# Altium footprint library connecteurs.PcbLib: 162 footprints (part 4 of 11)
Each footprint in its own frame and in the unit in brackets; x right, y up, seen from the top. Pads: shape width x height; smd on the part's side, far side on the other; paste and mask are expansions set on the pad; w line width, h text height; cw(c..) or ccw(c..) is an arc to the next point about the centre after c.
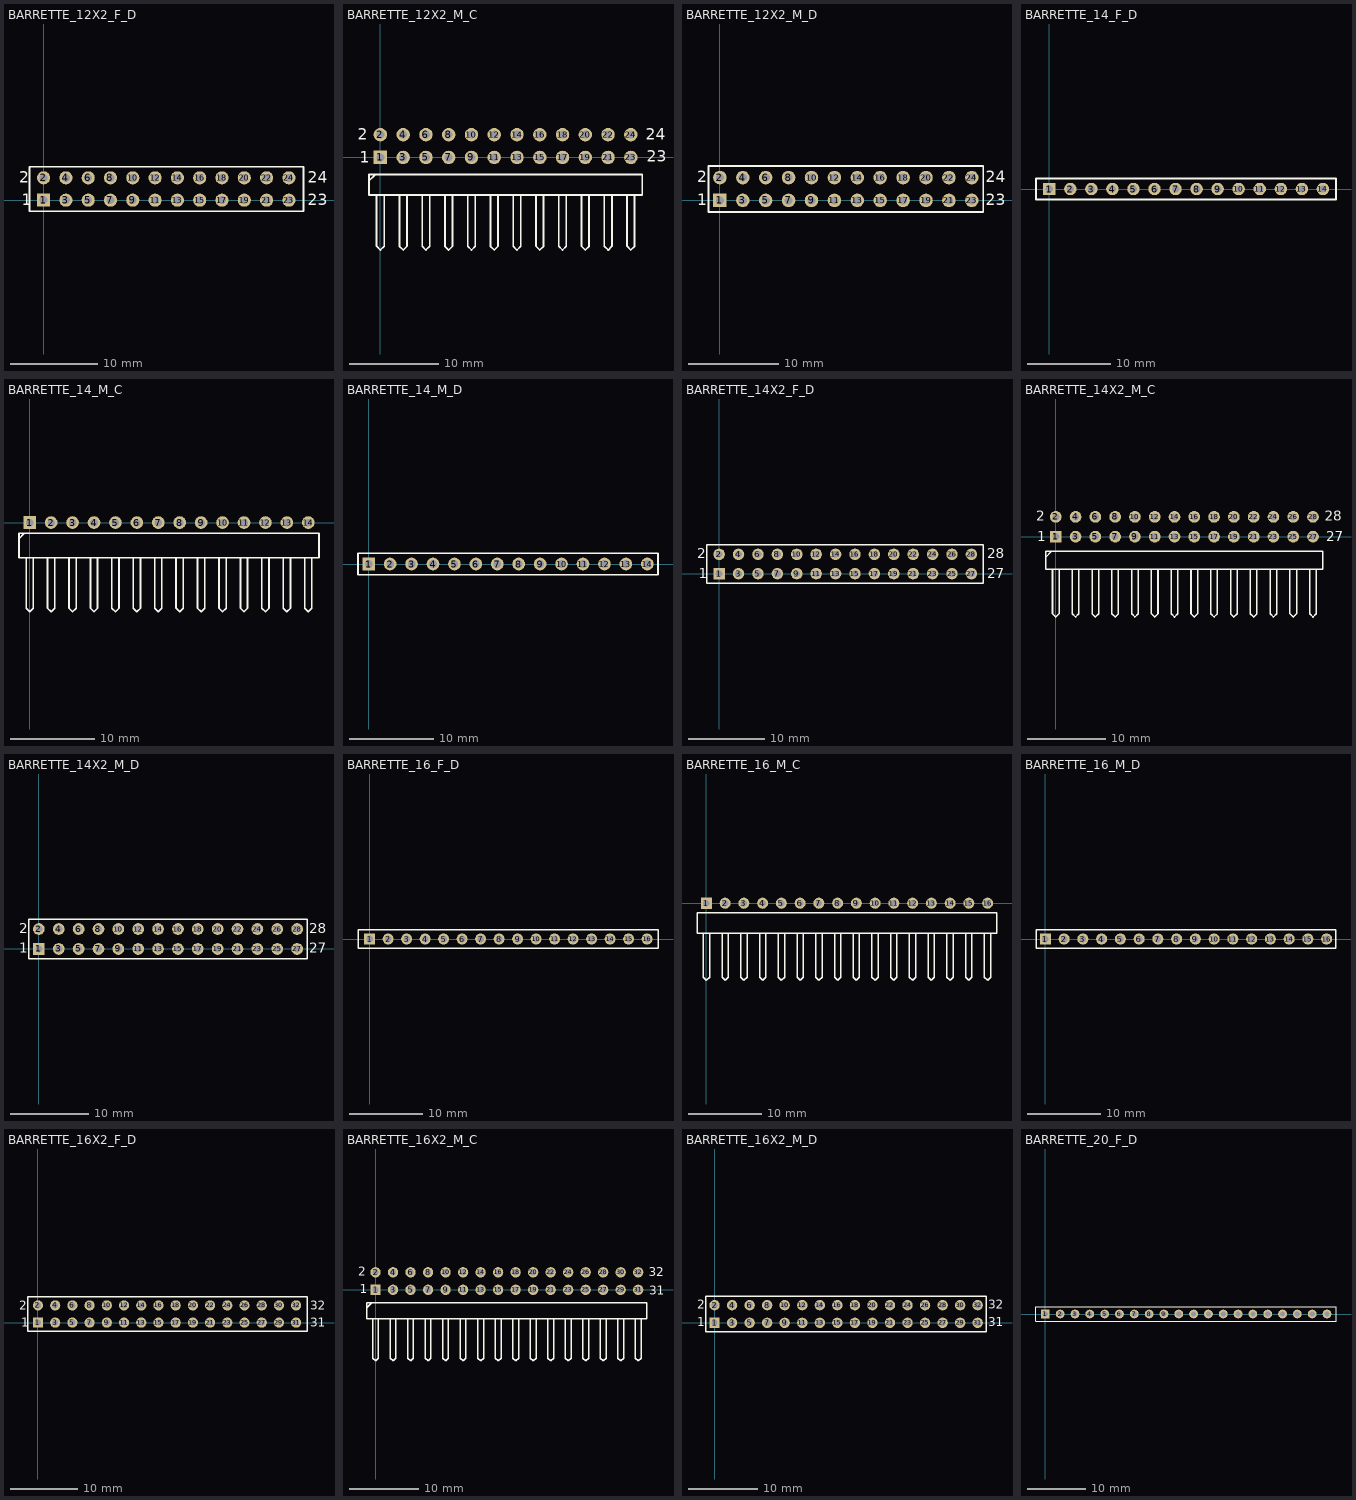
[diagram p3: the footprints below, top view; thin cyan lines are the x and y axes]

## BARRETTE_12X2_F_D [mm] "BARRETTE 12 CONTACTS ; 2 RANGEES ; DROITE ; FEMELLE ; ESPACEMENT BROCHES = 2.54 mm"
height 8.6
pads (24):
  rect 1.5x1.5 hole 0.9: 1(0,0)
  round 1.5 hole 0.9: 2(0,2.54) 3(2.54,0) 4(2.54,2.54) 5(5.08,0) 6(5.08,2.54) 7(7.62,0) 8(7.62,2.54) 9(10.16,0) 10(10.16,2.54) 11(12.7,0) 12(12.7,2.54) 13(15.24,0) 14(15.24,2.54) 15(17.78,0) 16(17.78,2.54) 17(20.32,0) 18(20.32,2.54) 19(22.86,0) 20(22.86,2.54) 21(25.4,0) 22(25.4,2.54) 23(27.94,0) 24(27.94,2.54)
Top Overlay:
  lines w0.2: -1.6,-1.27 29.6,-1.27 29.6,3.81 -1.6,3.81 -1.6,-1.27
  text "24" at 30.1,2 h1.27
  text "23" at 30.1,-0.6 h1.27
  text "2" at -2.8,2 h1.27
  text "1" at -2.5,-0.6 h1.27
3D body: height 8.5, standoff -2.65, extent -1.494,-1.2 29.494,3.753

## BARRETTE_12X2_M_C [mm] "BARRETTE 12 CONTACTS ; 2 RANGEES ; COUDEE ; MALE ; ESPACEMENT BROCHES = 2.54 mm"
height 5
pads (24):
  rect 1.5x1.5 hole 0.9: 1(0,0)
  round 1.5 hole 0.9: 2(0,2.54) 3(2.54,0) 4(2.54,2.54) 5(5.08,0) 6(5.08,2.54) 7(7.62,0) 8(7.62,2.54) 9(10.16,0) 10(10.16,2.54) 11(12.7,0) 12(12.7,2.54) 13(15.24,0) 14(15.24,2.54) 15(17.78,0) 16(17.78,2.54) 17(20.32,0) 18(20.32,2.54) 19(22.86,0) 20(22.86,2.54) 21(25.4,0) 22(25.4,2.54) 23(27.94,0) 24(27.94,2.54)
Top Overlay:
  lines w0.2: -1.27,-2.605 -0.635,-1.97 ; -0.423,-4.3 -0.423,-9.9 0,-10.323 0.423,-9.9 0.423,-4.2 ; 2.117,-4.2 2.117,-9.9 2.54,-10.323 2.963,-9.9 2.963,-4.2 ; 4.657,-4.2 4.657,-9.9 5.08,-10.323 5.503,-9.9 5.503,-4.2 ; 7.197,-4.2 7.197,-9.91 7.62,-10.333 ; 7.62,-10.323 8.043,-9.9 8.043,-4.2 ; 9.737,-4.3 9.737,-9.9 10.16,-10.323 10.583,-9.9 10.583,-4.2 ; 12.277,-4.2 12.277,-9.9 12.7,-10.323 13.123,-9.9 13.123,-4.2 ; 14.817,-4.2 14.817,-9.91 15.24,-10.333 ; 15.24,-10.323 15.663,-9.9 15.663,-4.2 ; 17.357,-4.3 17.357,-9.9 17.78,-10.323 18.203,-9.9 18.203,-4.2 ; 19.897,-4.2 19.897,-9.9 20.32,-10.323 20.743,-9.9 20.743,-4.2 ; 22.437,-4.2 22.437,-9.9 22.86,-10.323 23.283,-9.9 23.283,-4.2 ; 24.977,-4.2 24.977,-9.9 25.4,-10.323 ; 25.4,-10.333 25.823,-9.91 25.823,-4.2 ; 27.517,-4.2 27.517,-9.9 27.94,-10.323 28.363,-9.9 28.363,-4.2 ; -1.27,-4.2 -1.27,-1.9 29.21,-1.9 29.21,-4.2 -1.27,-4.2
  text "24" at 29.6,2 h1.27
  text "23" at 29.7,-0.5 h1.27
  text "2" at -2.5,2 h1.27
  text "1" at -2.3,-0.6 h1.27
3D body: height 5.64, standoff -2.23, extent -1.3,-9.9 29.18,2.863

## BARRETTE_12X2_M_D [mm] "BARRETTE 12 CONTACTS ; 2 RANGEES ; DROITE ; MALE ; ESPACEMENT BROCHES = 2.54 mm"
height 9.6
pads (24):
  rect 1.5x1.5 hole 0.9: 1(0,0)
  round 1.5 hole 0.9: 2(0,2.54) 3(2.54,0) 4(2.54,2.54) 5(5.08,0) 6(5.08,2.54) 7(7.62,0) 8(7.62,2.54) 9(10.16,0) 10(10.16,2.54) 11(12.7,0) 12(12.7,2.54) 13(15.24,0) 14(15.24,2.54) 15(17.78,0) 16(17.78,2.54) 17(20.32,0) 18(20.32,2.54) 19(22.86,0) 20(22.86,2.54) 21(25.4,0) 22(25.4,2.54) 23(27.94,0) 24(27.94,2.54)
Top Overlay:
  lines w0.2: -1.27,-1.27 29.21,-1.27 29.21,3.81 -1.27,3.81 -1.27,-1.27
  text "24" at 29.464,2.032 h1.27
  text "23" at 29.464,-0.508 h1.27
  text "2" at -2.54,2.032 h1.27
  text "1" at -2.54,-0.508 h1.27
3D body: height 10.67, standoff -2.79, extent -1.3,-1.24 29.18,3.84

## BARRETTE_14_F_D [mm] "BARRETTE 14 CONTACTS ; 1 RANGEE ; DROITE ; FEMELLE ; ESPACEMENT BROCHES = 2.54 mm"
height 8.6
pads (14):
  rect 1.5x1.5 hole 0.9: 1(0,0)
  round 1.5 hole 0.9: 2(2.54,0) 3(5.08,0) 4(7.62,0) 5(10.16,0) 6(12.7,0) 7(15.24,0) 8(17.78,0) 9(20.32,0) 10(22.86,0) 11(25.4,0) 12(27.94,0) 13(30.48,0) 14(33.02,0)
Top Overlay:
  lines w0.2: -1.6,-1.27 34.6,-1.27 34.6,1.27 0.635,1.27 -1.6,1.27 -1.6,-1.27
3D body: height 8.5, standoff -2.65, extent -1.534,-1.2 34.534,1.213

## BARRETTE_14_M_C [mm] "BARRETTE 14 CONTACTS ; 1 RANGEE ; COUDEE ; MALE ; ESPACEMENT BROCHES = 2.54 mm"
height 2.5
pads (14):
  rect 1.5x1.5 hole 0.9: 1(0,0)
  round 1.5 hole 0.9: 2(2.54,0) 3(5.08,0) 4(7.62,0) 5(10.16,0) 6(12.7,0) 7(15.24,0) 8(17.78,0) 9(20.32,0) 10(22.86,0) 11(25.4,0) 12(27.94,0) 13(30.48,0) 14(33.02,0)
Top Overlay:
  lines w0.2: -1.27,-1.905 -0.635,-1.27 ; -0.423,-4.16 -0.423,-10.15 0,-10.573 0.423,-10.15 0.423,-4.16 ; 2.117,-4.16 2.117,-10.15 2.54,-10.573 2.963,-10.15 2.963,-4.16 ; 4.657,-4.16 4.657,-10.15 5.08,-10.573 5.503,-10.15 5.503,-4.16 ; 7.197,-4.16 7.197,-10.15 7.62,-10.573 8.043,-10.15 8.043,-4.16 ; 9.737,-4.16 9.737,-10.15 10.16,-10.573 10.583,-10.15 10.583,-4.16 ; 12.277,-4.16 12.277,-10.15 12.7,-10.573 13.123,-10.15 13.123,-4.16 ; 14.817,-4.16 14.817,-10.15 15.24,-10.573 15.663,-10.15 15.663,-4.16 ; 17.35,-4.153 17.35,-10.15 17.773,-10.573 ; 17.78,-10.573 18.203,-10.15 18.203,-4.16 ; 19.897,-4.16 19.897,-10.15 20.32,-10.573 20.743,-10.15 20.743,-4.16 ; 22.437,-4.16 22.437,-10.15 22.86,-10.573 23.283,-10.15 23.283,-4.16 ; 24.977,-4.16 24.977,-10.15 25.4,-10.573 25.823,-10.15 25.823,-4.16 ; 27.517,-4.16 27.517,-10.15 27.94,-10.573 28.363,-10.15 28.363,-4.16 ; 30.057,-4.16 30.057,-10.15 30.48,-10.573 30.903,-10.15 30.903,-4.16 ; 32.597,-4.16 32.597,-10.14 33.02,-10.563 ; 33.02,-10.573 33.443,-10.15 33.443,-4.16 ; -1.27,-4.16 34.29,-4.16 34.29,-1.27 0.635,-1.27 -1.27,-1.27 -1.27,-4.16

## BARRETTE_14_M_D [mm] "BARRETTE 14 CONTACTS ; 1 RANGEE ; DROITE ; MALE ; ESPACEMENT BROCHES = 2.54 mm"
height 9.6
pads (14):
  rect 1.5x1.5 hole 0.9: 1(0,0)
  round 1.5 hole 0.9: 2(2.54,0) 3(5.08,0) 4(7.62,0) 5(10.16,0) 6(12.7,0) 7(15.24,0) 8(17.78,0) 9(20.32,0) 10(22.86,0) 11(25.4,0) 12(27.94,0) 13(30.48,0) 14(33.02,0)
Top Overlay:
  lines w0.2: -1.27,-1.27 -1.27,1.27 0.635,1.27 34.29,1.27 34.29,-1.27 -1.27,-1.27
3D body: height 10.1, standoff -1.5, extent -1.28,-1.3 34.28,1.24

## BARRETTE_14X2_F_D [mm] "BARRETTE 14 CONTACTS ; 2 RANGEES ; DROITE ; FEMELLE ; ESPACEMENT BROCHES = 2.54 mm"
height 8.6
pads (28):
  rect 1.5x1.5 hole 0.9: 1(0,0)
  round 1.5 hole 0.9: 2(0,2.54) 3(2.54,0) 4(2.54,2.54) 5(5.08,0) 6(5.08,2.54) 7(7.62,0) 8(7.62,2.54) 9(10.16,0) 10(10.16,2.54) 11(12.7,0) 12(12.7,2.54) 13(15.24,0) 14(15.24,2.54) 15(17.78,0) 16(17.78,2.54) 17(20.32,0) 18(20.32,2.54) 19(22.86,0) 20(22.86,2.54) 21(25.4,0) 22(25.4,2.54) 23(27.94,0) 24(27.94,2.54) 25(30.48,0) 26(30.48,2.54) 27(33.02,0) 28(33.02,2.54)
Top Overlay:
  lines w0.2: -1.6,-1.27 -1.6,3.81 34.6,3.81 34.6,-1.27 -1.6,-1.27
  text "2" at -2.9,2 h1.27
  text "1" at -2.7,-0.6 h1.27
  text "27" at 35.1,-0.6 h1.27
  text "28" at 35.1,2 h1.27
3D body: height 8.5, standoff -2.65, extent -1.534,-1.253 34.534,3.7

## BARRETTE_14X2_M_C [mm] "BARRETTE 14 CONTACTS ; 2 RANGEES ; COUDEE ; MALE ; ESPACEMENT BROCHES = 2.54 mm"
height 5
pads (28):
  rect 1.5x1.5 hole 0.9: 1(0,0)
  round 1.5 hole 0.9: 2(0,2.54) 3(2.54,0) 4(2.54,2.54) 5(5.08,0) 6(5.08,2.54) 7(7.62,0) 8(7.62,2.54) 9(10.16,0) 10(10.16,2.54) 11(12.7,0) 12(12.7,2.54) 13(15.24,0) 14(15.24,2.54) 15(17.78,0) 16(17.78,2.54) 17(20.32,0) 18(20.32,2.54) 19(22.86,0) 20(22.86,2.54) 21(25.4,0) 22(25.4,2.54) 23(27.94,0) 24(27.94,2.54) 25(30.48,0) 26(30.48,2.54) 27(33.02,0) 28(33.02,2.54)
Top Overlay:
  lines w0.2: -1.27,-2.605 -0.635,-1.97 ; -0.423,-4.2 -0.423,-9.9 0,-10.323 0.423,-9.9 0.423,-4.2 ; 2.117,-4.2 2.117,-9.9 2.54,-10.323 2.963,-9.9 2.963,-4.3 ; 4.657,-4.2 4.657,-9.9 5.08,-10.323 5.503,-9.9 5.503,-4.2 ; 7.197,-4.2 7.197,-9.9 7.62,-10.323 8.043,-9.9 8.043,-4.2 ; 9.737,-4.2 9.737,-9.9 10.16,-10.323 10.583,-9.9 10.583,-4.2 ; 12.277,-4.2 12.277,-9.9 12.7,-10.323 13.123,-9.9 13.123,-4.2 ; 14.817,-4.2 14.817,-9.9 15.24,-10.323 15.663,-9.9 15.663,-4.2 ; 17.357,-4.2 17.357,-9.9 17.78,-10.323 18.203,-9.9 18.203,-4.2 ; 19.897,-4.2 19.897,-9.9 20.32,-10.323 20.743,-9.9 20.743,-4.2 ; 22.437,-4.2 22.437,-9.9 22.86,-10.323 23.283,-9.9 23.283,-4.2 ; 24.977,-4.2 24.977,-9.9 25.4,-10.323 25.823,-9.9 25.823,-4.2 ; 27.517,-4.2 27.517,-9.89 27.94,-10.313 ; 27.94,-10.323 28.363,-9.9 28.363,-4.2 ; 30.057,-4.2 30.057,-9.9 30.48,-10.323 30.903,-9.9 30.903,-4.2 ; 32.597,-4.2 32.597,-9.9 33.02,-10.323 33.443,-9.9 33.443,-4.2 ; -1.27,-4.2 34.29,-4.2 34.29,-1.9 -1.27,-1.9 -1.27,-4.2
  text "2" at -2.54,2.032 h1.27
  text "1" at -2.4,-0.6 h1.27
  text "27" at 34.7,-0.6 h1.27
  text "28" at 34.544,2.032 h1.27
3D body: height 5.64, standoff -2.23, extent -1.3,-9.9 34.26,2.863

## BARRETTE_14X2_M_D [mm] "BARRETTE 14 CONTACTS ; 2 RANGEES ; DROITE ; MALE ; ESPACEMENT BROCHES = 2.54 mm"
height 9.6
pads (28):
  rect 1.5x1.5 hole 0.9: 1(0,0)
  round 1.5 hole 0.9: 2(0,2.54) 3(2.54,0) 4(2.54,2.54) 5(5.08,0) 6(5.08,2.54) 7(7.62,0) 8(7.62,2.54) 9(10.16,0) 10(10.16,2.54) 11(12.7,0) 12(12.7,2.54) 13(15.24,0) 14(15.24,2.54) 15(17.78,0) 16(17.78,2.54) 17(20.32,0) 18(20.32,2.54) 19(22.86,0) 20(22.86,2.54) 21(25.4,0) 22(25.4,2.54) 23(27.94,0) 24(27.94,2.54) 25(30.48,0) 26(30.48,2.54) 27(33.02,0) 28(33.02,2.54)
Top Overlay:
  lines w0.2: -1.27,-1.27 34.29,-1.27 34.29,3.81 -1.27,3.81 -1.27,-1.27
  text "28" at 34.544,2.032 h1.27
  text "27" at 34.544,-0.508 h1.27
  text "1" at -2.54,-0.508 h1.27
  text "2" at -2.54,2.032 h1.27
3D body: height 10.67, standoff -2.79, extent -1.3,-1.3 34.26,3.78

## BARRETTE_16_F_D [mm] "BARRETTE 16 CONTACTS ; 1 RANGEE ; DROITEE ; FEMELLE ; ESPACEMENT BROCHES = 2.54 mm"
height 8.6
pads (16):
  rect 1.5x1.5 hole 0.9: 1(0,0)
  round 1.5 hole 0.9: 2(2.54,0) 3(5.08,0) 4(7.62,0) 5(10.16,0) 6(12.7,0) 7(15.24,0) 8(17.78,0) 9(20.32,0) 10(22.86,0) 11(25.4,0) 12(27.94,0) 13(30.48,0) 14(33.02,0) 15(35.56,0) 16(38.1,0)
Top Overlay:
  lines w0.2: -1.6,-1.27 39.6,-1.27 39.6,1.27 0.635,1.27 -1.6,1.27 -1.6,-1.27
3D body: height 8.5, standoff -2.65, extent -1.574,-1.2 39.574,1.213

## BARRETTE_16_M_C [mm] "BARRETTE 16 CONTACTS ; 1 RANGEE ; COUDEE ; MALE ; ESPACEMENT BROCHES = 2.54 mm"
height 2.5
pads (16):
  rect 1.5x1.5 hole 0.9: 1(0,0)
  round 1.5 hole 0.9: 2(2.54,0) 3(5.08,0) 4(7.62,0) 5(10.16,0) 6(12.7,0) 7(15.24,0) 8(17.78,0) 9(20.32,0) 10(22.86,0) 11(25.4,0) 12(27.94,0) 13(30.48,0) 14(33.02,0) 15(35.56,0) 16(38.1,0)
Top Overlay:
  lines w0.2: -0.423,-4.05 -0.423,-10.02 0,-10.443 0.423,-10.02 0.423,-4.05 ; 2.117,-4.06 2.117,-10.02 2.54,-10.443 2.963,-10.02 2.963,-4.06 ; 4.657,-4.07 4.657,-10.02 5.08,-10.443 5.503,-10.02 5.503,-4.06 ; 7.197,-4.05 7.197,-10.02 7.62,-10.443 ; 7.62,-10.433 8.043,-10.01 8.043,-4.06 ; 9.737,-4.06 9.737,-10.02 10.16,-10.443 10.583,-10.02 10.583,-4.06 ; 12.277,-4.06 12.277,-10.02 12.7,-10.443 13.123,-10.02 13.123,-4.06 ; 14.817,-4.06 14.817,-10.02 15.24,-10.443 ; 15.24,-10.433 15.663,-10.01 15.663,-4.08 ; 17.357,-4.07 17.357,-10.02 17.78,-10.443 18.203,-10.02 18.203,-4.07 ; 19.897,-4.05 19.897,-10.02 20.32,-10.443 ; 20.32,-10.433 20.743,-10.01 20.743,-4.06 ; 22.437,-4.05 22.437,-10.02 22.86,-10.443 23.283,-10.02 23.283,-4.05 ; 24.977,-4.06 24.977,-10.02 25.4,-10.443 25.823,-10.02 25.823,-4.05 ; 27.517,-4.06 27.517,-10.02 27.94,-10.443 28.363,-10.02 28.363,-4.06 ; 30.057,-4.06 30.057,-10.02 30.48,-10.443 30.903,-10.02 30.903,-4.05 ; 32.597,-4.06 32.597,-10.02 33.02,-10.443 33.443,-10.02 33.443,-4.07 ; 35.137,-4.06 35.137,-10.02 35.56,-10.443 35.983,-10.02 35.983,-4.06 ; 37.677,-4.07 37.677,-10.02 38.1,-10.443 38.523,-10.02 38.523,-4.06 ; -1.27,-4.05 -1.27,-1.27 0.635,-1.27 39.37,-1.27 39.37,-4.05 -1.27,-4.05
3D body: height 2.55, standoff -1.95, extent 29.21,-10.02 39.37,0.3
3D body: height 2.55, standoff -1.95, extent 19.05,-10.02 29.21,0.3
3D body: height 2.55, standoff -1.95, extent 8.89,-10.02 19.05,0.3
3D body: height 2.55, standoff -1.95, extent -1.27,-10.02 8.89,0.3

## BARRETTE_16_M_D [mm] "BARRETTE 16 CONTACTS ; 1 RANGEE ; DROITE ; MALE ; ESPACEMENT BROCHES = 2.54 mm"
height 9.6
pads (16):
  rect 1.5x1.5 hole 0.9: 1(0,0)
  round 1.5 hole 0.9: 2(2.54,0) 3(5.08,0) 4(7.62,0) 5(10.16,0) 6(12.7,0) 7(15.24,0) 8(17.78,0) 9(20.32,0) 10(22.86,0) 11(25.4,0) 12(27.94,0) 13(30.48,0) 14(33.02,0) 15(35.56,0) 16(38.1,0)
Top Overlay:
  lines w0.2: -1.27,-1.27 39.37,-1.27 39.37,1.27 0.635,1.27 -1.27,1.27 -1.27,-1.27
3D body: height 10.1, standoff -1.5, extent -1.32,-1.24 39.32,1.3

## BARRETTE_16X2_F_D [mm] "BARRETTE 16 CONTACTS ; 2 RANGEES ; DROITE ; FEMELLE ; ESPACEMENT BROCHES = 2.54 mm"
height 8.6
pads (32):
  rect 1.5x1.5 hole 0.9: 1(0,0)
  round 1.5 hole 0.9: 2(0,2.54) 3(2.54,0) 4(2.54,2.54) 5(5.08,0) 6(5.08,2.54) 7(7.62,0) 8(7.62,2.54) 9(10.16,0) 10(10.16,2.54) 11(12.7,0) 12(12.7,2.54) 13(15.24,0) 14(15.24,2.54) 15(17.78,0) 16(17.78,2.54) 17(20.32,0) 18(20.32,2.54) 19(22.86,0) 20(22.86,2.54) 21(25.4,0) 22(25.4,2.54) 23(27.94,0) 24(27.94,2.54) 25(30.48,0) 26(30.48,2.54) 27(33.02,0) 28(33.02,2.54) 29(35.56,0) 30(35.56,2.54) 31(38.1,0) 32(38.1,2.54)
Top Overlay:
  lines w0.2: -1.5,-1.27 39.7,-1.27 39.7,3.81 -1.5,3.81 -1.5,-1.27
  text "2" at -2.8,1.9 h1.27
  text "1" at -2.5,-0.6 h1.27
  text "31" at 40.2,-0.6 h1.27
  text "32" at 40.2,1.9 h1.27
3D body: height 8.5, standoff -2.65, extent -1.474,-1.2 39.674,3.753

## BARRETTE_16X2_M_C [mm] "BARRETTE 16 CONTACTS ; 2 RANGEES ; COUDEE ; MALE ; ESPACEMENT BROCHES = 2.54 mm"
height 5
pads (32):
  rect 1.5x1.5 hole 0.9: 1(0,0)
  round 1.5 hole 0.9: 2(0,2.54) 3(2.54,0) 4(2.54,2.54) 5(5.08,0) 6(5.08,2.54) 7(7.62,0) 8(7.62,2.54) 9(10.16,0) 10(10.16,2.54) 11(12.7,0) 12(12.7,2.54) 13(15.24,0) 14(15.24,2.54) 15(17.78,0) 16(17.78,2.54) 17(20.32,0) 18(20.32,2.54) 19(22.86,0) 20(22.86,2.54) 21(25.4,0) 22(25.4,2.54) 23(27.94,0) 24(27.94,2.54) 25(30.48,0) 26(30.48,2.54) 27(33.02,0) 28(33.02,2.54) 29(35.56,0) 30(35.56,2.54) 31(38.1,0) 32(38.1,2.54)
Top Overlay:
  lines w0.2: -1.27,-2.605 -0.635,-1.97 ; -0.423,-4.2 -0.423,-9.9 0,-10.323 0.423,-9.9 0.423,-4.2 ; 2.117,-4.2 2.117,-9.9 2.54,-10.323 2.963,-9.9 2.963,-4.2 ; 4.657,-4.3 4.657,-9.9 5.08,-10.323 5.503,-9.9 5.503,-4.2 ; 7.197,-4.2 7.197,-9.9 7.62,-10.323 8.043,-9.9 8.043,-4.2 ; 9.737,-4.2 9.737,-9.9 10.16,-10.323 10.583,-9.9 10.583,-4.3 ; 12.277,-4.2 12.277,-9.9 12.7,-10.323 13.123,-9.9 13.123,-4.2 ; 14.817,-4.2 14.817,-9.9 15.24,-10.323 15.663,-9.9 15.663,-4.2 ; 17.357,-4.2 17.357,-9.9 17.78,-10.323 18.203,-9.9 18.203,-4.2 ; 19.897,-4.2 19.897,-9.9 20.32,-10.323 20.743,-9.9 20.743,-4.2 ; 22.437,-4.2 22.437,-9.9 22.86,-10.323 23.283,-9.9 23.283,-4.3 ; 24.977,-4.2 24.977,-9.9 25.4,-10.323 25.823,-9.9 25.823,-4.2 ; 27.517,-4.3 27.517,-9.9 27.94,-10.323 28.363,-9.9 28.363,-4.2 ; 30.057,-4.2 30.057,-9.9 30.48,-10.323 30.903,-9.9 30.903,-4.2 ; 32.597,-4.2 32.597,-9.9 33.02,-10.323 33.443,-9.9 33.443,-4.2 ; 35.137,-4.2 35.137,-9.9 35.56,-10.323 35.983,-9.9 35.983,-4.2 ; 37.677,-4.2 37.677,-9.9 38.1,-10.323 38.523,-9.9 38.523,-4.3 ; -1.27,-4.2 -1.27,-1.9 39.37,-1.9 39.37,-4.2 -1.27,-4.2
  text "2" at -2.54,2.032 h1.27
  text "1" at -2.3,-0.5 h1.27
  text "31" at 39.7,-0.7 h1.27
  text "32" at 39.6,2 h1.27
3D body: height 5.64, standoff -2.23, extent -1.3,-9.9 39.34,2.863

## BARRETTE_16X2_M_D [mm] "BARRETTE 16 CONTACTS ; 2 RANGEES ; DROITE ; MALE ; ESPACEMENT BROCHES = 2.54 mm"
height 9.6
pads (32):
  rect 1.5x1.5 hole 0.9: 1(0,0)
  round 1.5 hole 0.9: 2(0,2.54) 3(2.54,0) 4(2.54,2.54) 5(5.08,0) 6(5.08,2.54) 7(7.62,0) 8(7.62,2.54) 9(10.16,0) 10(10.16,2.54) 11(12.7,0) 12(12.7,2.54) 13(15.24,0) 14(15.24,2.54) 15(17.78,0) 16(17.78,2.54) 17(20.32,0) 18(20.32,2.54) 19(22.86,0) 20(22.86,2.54) 21(25.4,0) 22(25.4,2.54) 23(27.94,0) 24(27.94,2.54) 25(30.48,0) 26(30.48,2.54) 27(33.02,0) 28(33.02,2.54) 29(35.56,0) 30(35.56,2.54) 31(38.1,0) 32(38.1,2.54)
Top Overlay:
  lines w0.2: -1.27,-1.27 -1.27,3.81 39.37,3.81 39.37,-1.27 -1.27,-1.27
  text "32" at 39.624,2.032 h1.27
  text "31" at 39.624,-0.508 h1.27
  text "1" at -2.54,-0.508 h1.27
  text "2" at -2.54,2.032 h1.27
3D body: height 10.67, standoff -2.79, extent -1.3,-1.24 39.34,3.84

## BARRETTE_20_F_D [mm] "BARRETTE 20 CONTACTS ; 1 RANGEE ; DROITE ; FEMELLE ; ESPACEMENT BROCHES = 2.54 mm"
height 8.6
pads (20):
  rect 1.5x1.5 hole 0.9: 1(0,0)
  round 1.5 hole 0.9: 2(2.54,0) 3(5.08,0) 4(7.62,0) 5(10.16,0) 6(12.7,0) 7(15.24,0) 8(17.78,0) 9(20.32,0) 10(22.86,0) 11(25.4,0) 12(27.94,0) 13(30.48,0) 14(33.02,0) 15(35.56,0) 16(38.1,0) 17(40.64,0) 18(43.18,0) 19(45.72,0) 20(48.26,0)
Top Overlay:
  lines w0.2: -1.6,-1.27 49.8,-1.27 49.8,1.27 0.635,1.27 -1.6,1.27 -1.6,-1.27
3D body: height 8.5, standoff -2.65, extent -1.554,-1.2 49.754,1.213